# Altium footprint library BASIC.PcbLib: 244 footprints (part 11 of 16)
Each footprint in its own frame and in the unit in brackets; x right, y up, seen from the top. Pads: shape width x height; smd on the part's side, far side on the other; paste and mask are expansions set on the pad; w line width, h text height; cw(c..) or ccw(c..) is an arc to the next point about the centre after c.
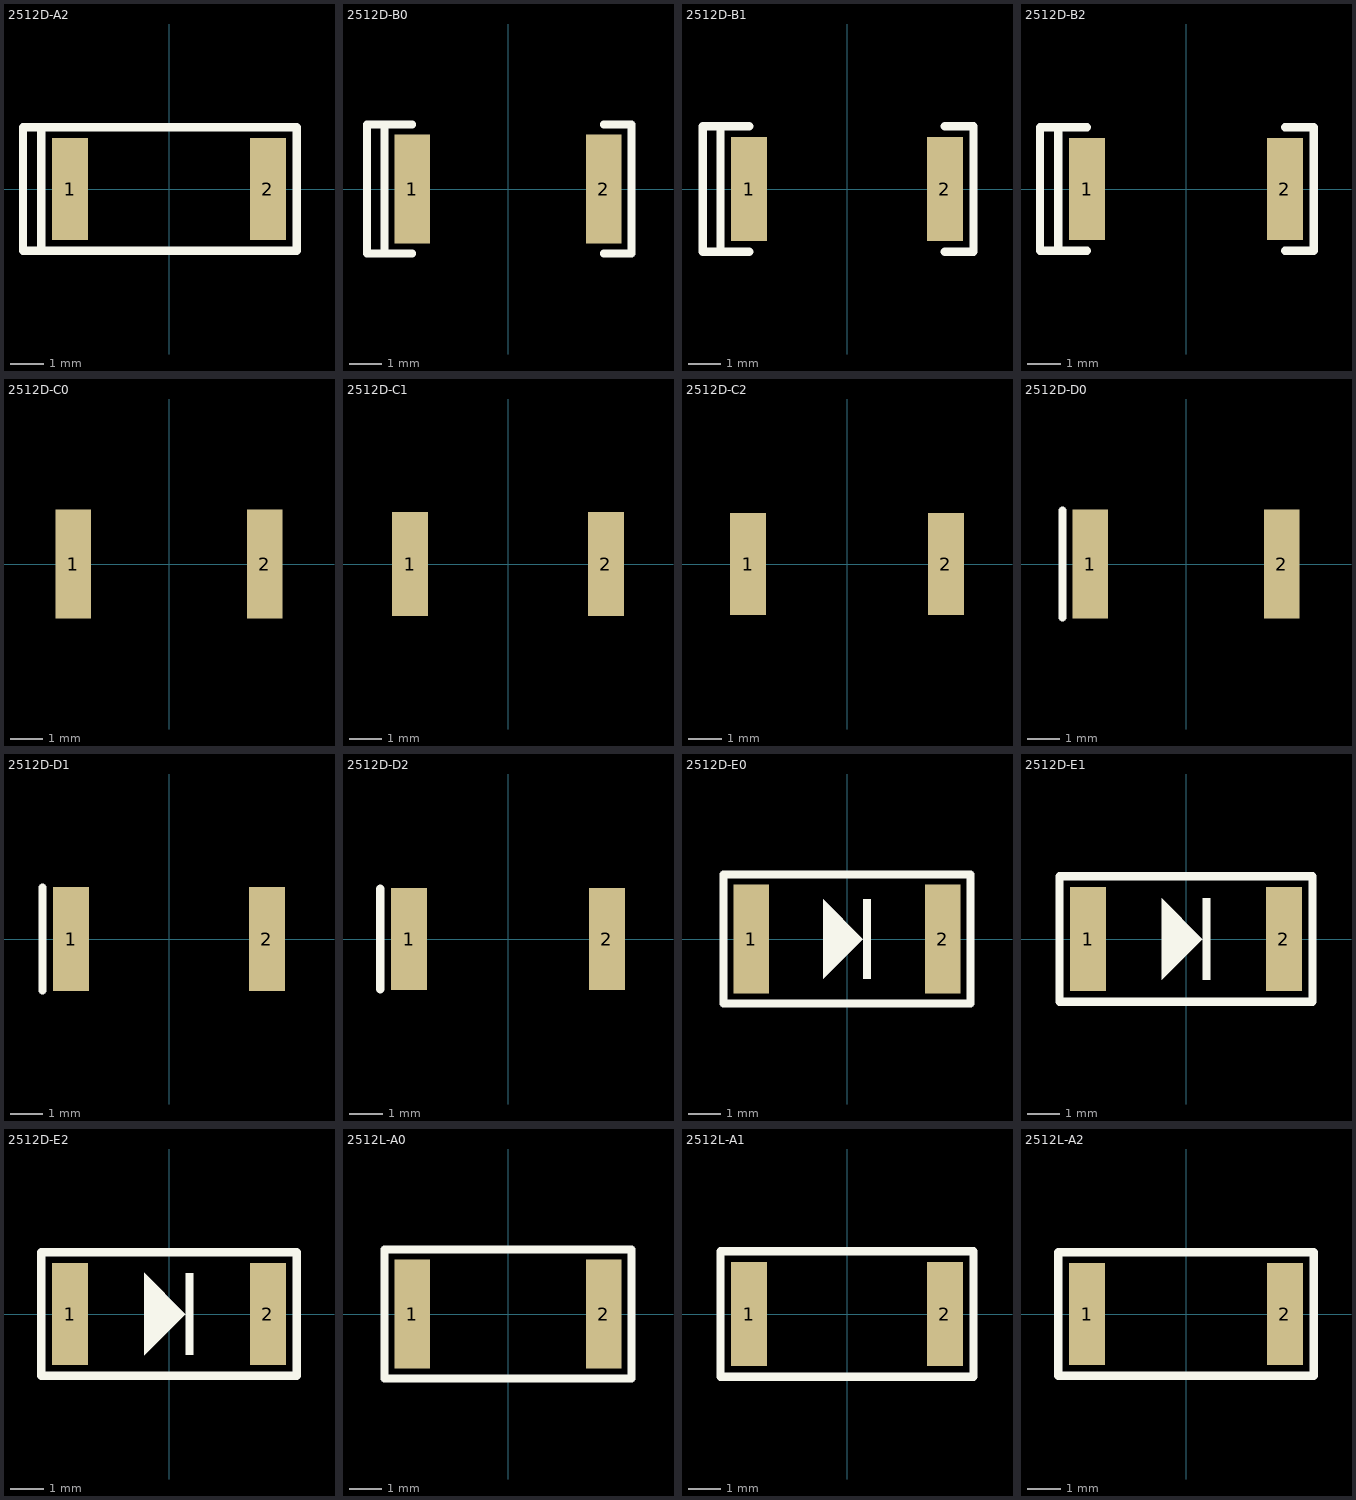
[diagram p10: the footprints below, top view; thin cyan lines are the x and y axes]

## 2512D-A2 [mm]
height 0.7
pads (2):
  rect 1.1x3.1 smd: 1(-3,0) 2(3,0)
Top Overlay:
  lines w0.25: -3.925,-1.875 3.875,-1.875 3.875,1.875 -3.925,1.875 ; -4.425,-1.875 -3.875,-1.875 -3.875,1.875 -4.425,1.875 -4.425,-1.875
3D body "RES2512.STEP": height 0.62, standoff 0, extent -3.16,-1.6 3.16,1.6

## 2512D-B0 [mm]
height 0.7
pads (2):
  rect 1.1x3.4 smd: 1(-3,0) 2(3,0)
Top Overlay:
  lines w0.25: -3,-2.025 -3.875,-2.025 ; -3,2.025 -3.875,2.025 ; 3,-2.025 3.875,-2.025 3.875,2.025 3,2.025 ; -3.875,-2.025 -4.425,-2.025 -4.425,2.025 -3.875,2.025 ; -3.875,-2.025 -3.875,2.025
3D body "RES2512.STEP": height 0.62, standoff 0, extent -3.16,-1.6 3.16,1.6

## 2512D-B1 [mm]
height 0.7
pads (2):
  rect 1.1x3.2 smd: 1(-3,0) 2(3,0)
Top Overlay:
  lines w0.25: -3,-1.925 -3.875,-1.925 ; -3,1.925 -3.875,1.925 ; 3,-1.925 3.875,-1.925 3.875,1.925 3,1.925 ; -3.875,-1.925 -4.425,-1.925 -4.425,1.925 -3.875,1.925 ; -3.875,-1.925 -3.875,1.925
3D body "RES2512.STEP": height 0.62, standoff 0, extent -3.16,-1.6 3.16,1.6

## 2512D-B2 [mm]
height 0.7
pads (2):
  rect 1.1x3.1 smd: 1(-3,0) 2(3,0)
Top Overlay:
  lines w0.25: -3,-1.875 -3.875,-1.875 ; -3,1.875 -3.875,1.875 ; 3,-1.875 3.875,-1.875 3.875,1.875 3,1.875 ; -3.875,-1.875 -3.875,1.875 ; -3.875,-1.875 -4.425,-1.875 -4.425,1.875 -3.875,1.875
3D body "RES2512.STEP": height 0.62, standoff 0, extent -3.16,-1.6 3.16,1.6

## 2512D-C0 [mm]
height 0.7
pads (2):
  rect 1.1x3.4 smd: 1(-3,0) 2(3,0)
3D body "RES2512.STEP": height 0.62, standoff 0, extent -3.16,-1.6 3.16,1.6

## 2512D-C1 [mm]
height 0.7
pads (2):
  rect 1.1x3.2 smd: 1(-3,0) 2(3,0)
3D body "RES2512.STEP": height 0.62, standoff 0, extent -3.16,-1.6 3.16,1.6

## 2512D-C2 [mm]
height 0.7
pads (2):
  rect 1.1x3.1 smd: 1(-3,0) 2(3,0)
3D body "RES2512.STEP": height 0.62, standoff 0, extent -3.16,-1.6 3.16,1.6

## 2512D-D0 [mm]
height 0.7
pads (2):
  rect 1.1x3.4 smd: 1(-3,0) 2(3,0)
Top Overlay:
  lines w0.25: -3.875,-1.675 -3.875,1.675
3D body "RES2512.STEP": height 0.62, standoff 0, extent -3.16,-1.6 3.16,1.6

## 2512D-D1 [mm]
height 0.7
pads (2):
  rect 1.1x3.2 smd: 1(-3,0) 2(3,0)
Top Overlay:
  lines w0.25: -3.875,-1.575 -3.875,1.575
3D body "RES2512.STEP": height 0.62, standoff 0, extent -3.16,-1.6 3.16,1.6

## 2512D-D2 [mm]
height 0.7
pads (2):
  rect 1.1x3.1 smd: 1(-3,0) 2(3,0)
Top Overlay:
  lines w0.25: -3.875,-1.525 -3.875,1.525
3D body "RES2512.STEP": height 0.62, standoff 0, extent -3.16,-1.6 3.16,1.6

## 2512D-E0 [mm]
height 0.7
pads (2):
  rect 1.1x3.4 smd: 1(-3,0) 2(3,0)
Top Overlay:
  rectangle: 0.5,-1.25 0.75,1.25
  region: -0.75,1.25 -0.75,-1.25 0.5,0
  lines w0.25: -3.875,-2.025 -3.875,2.025 3.875,2.025 3.875,-2.025 -3.875,-2.025
3D body "RES2512.STEP": height 0.62, standoff 0, extent -3.16,-1.6 3.16,1.6

## 2512D-E1 [mm]
height 0.7
pads (2):
  rect 1.1x3.2 smd: 1(-3,0) 2(3,0)
Top Overlay:
  rectangle: 0.5,-1.25 0.75,1.25
  region: -0.75,1.25 -0.75,-1.25 0.5,0
  region: -1,-0.75
  lines w0.25: -3.875,-1.925 -3.875,1.925 3.875,1.925 3.875,-1.925 -3.875,-1.925
3D body "RES2512.STEP": height 0.62, standoff 0, extent -3.16,-1.6 3.16,1.6

## 2512D-E2 [mm]
height 0.7
pads (2):
  rect 1.1x3.1 smd: 1(-3,0) 2(3,0)
Top Overlay:
  rectangle: 0.5,-1.25 0.75,1.25
  region: -0.75,1.25 -0.75,-1.25 0.5,0
  lines w0.25: -3.875,-1.875 -3.875,1.875 3.875,1.875 3.875,-1.875 -3.875,-1.875
3D body "RES2512.STEP": height 0.62, standoff 0, extent -3.16,-1.6 3.16,1.6

## 2512L-A0 [mm]
height 0.7
pads (2):
  rect 1.1x3.4 smd: 1(-3,0) 2(3,0)
Top Overlay:
  lines w0.25: -3.875,-2.025 3.875,-2.025 3.875,2.025 -3.875,2.025 -3.875,-2.025
3D body "RES2512.STEP": height 0.62, standoff 0, extent -3.16,-1.6 3.16,1.6

## 2512L-A1 [mm]
height 0.7
pads (2):
  rect 1.1x3.2 smd: 1(-3,0) 2(3,0)
Top Overlay:
  lines w0.25: -3.875,-1.925 -3.875,1.925 3.875,1.925 3.875,-1.925 -3.875,-1.925
3D body "RES2512.STEP": height 0.62, standoff 0, extent -3.16,-1.6 3.16,1.6

## 2512L-A2 [mm]
height 0.7
pads (2):
  rect 1.1x3.1 smd: 1(-3,0) 2(3,0)
Top Overlay:
  lines w0.25: -3.875,-1.875 3.875,-1.875 3.875,1.875 -3.875,1.875 -3.875,-1.875
3D body "RES2512.STEP": height 0.62, standoff 0, extent -3.16,-1.6 3.16,1.6